# Altium footprint library pcb_library.PcbLib: 45 footprints (part 2 of 3)
Each footprint in its own frame and in the unit in brackets; x right, y up, seen from the top. Pads: shape width x height; smd on the part's side, far side on the other; paste and mask are expansions set on the pad; w line width, h text height; cw(c..) or ccw(c..) is an arc to the next point about the centre after c.
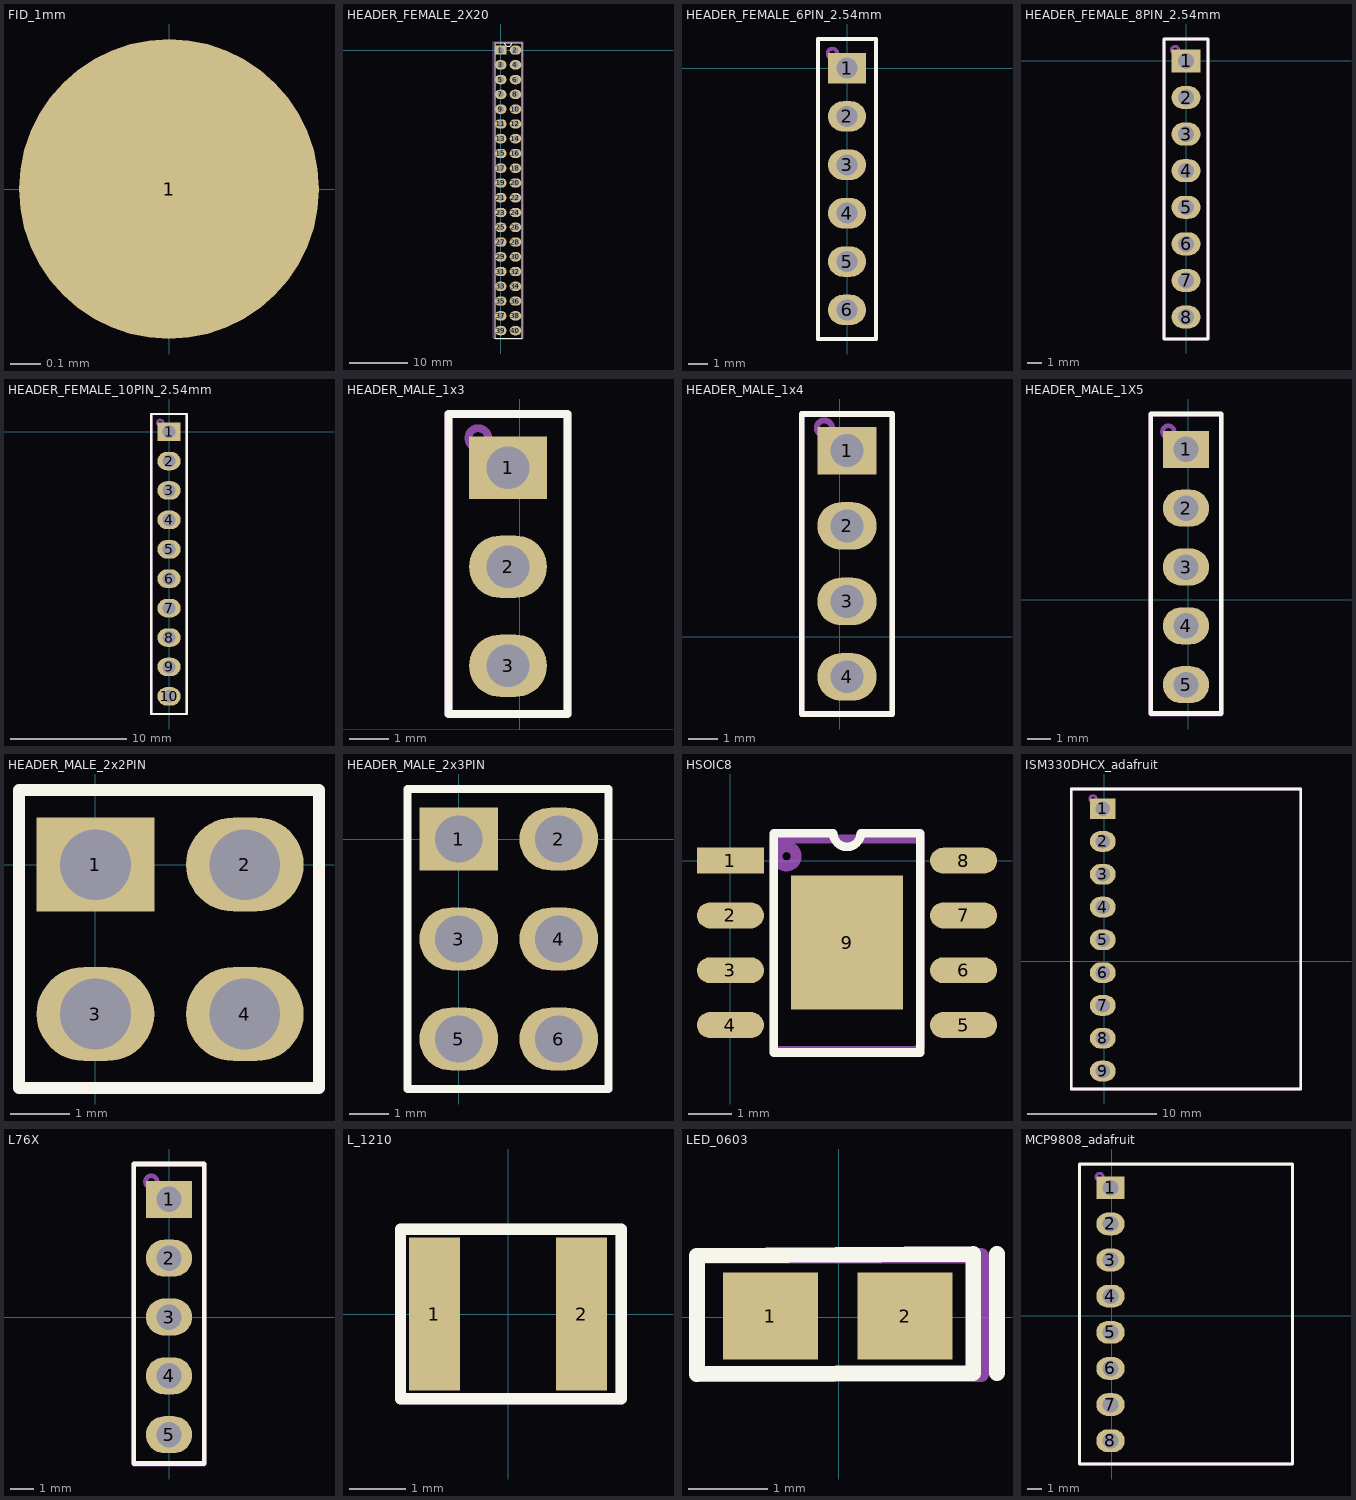
[diagram p1: the footprints below, top view; thin cyan lines are the x and y axes]

## FID_1mm [mm]
pads (1):
  round 1 smd paste-1 mask+1: 1(0,0)

## HEADER_FEMALE_2X20 [mm]
pads (40):
  rect 2x1.6 hole 1.1: 1(0,0)
  oval 2x1.6 hole 1.1: 2(2.54,0) 3(0,-2.54) 4(2.54,-2.54) 5(0,-5.08) 6(2.54,-5.08) 7(0,-7.62) 8(2.54,-7.62) 9(0,-10.16) 10(2.54,-10.16) 11(0,-12.7) 12(2.54,-12.7) 13(0,-15.24) 14(2.54,-15.24) 15(0,-17.78) 16(2.54,-17.78) 17(0,-20.32) 18(2.54,-20.32) 19(0,-22.86) 20(2.54,-22.86) 21(0,-25.4) 22(2.54,-25.4) 23(0,-27.94) 24(2.54,-27.94) 25(0,-30.48) 26(2.54,-30.48) 27(0,-33.02) 28(2.54,-33.02) 29(0,-35.56) 30(2.54,-35.56) 31(0,-38.1) 32(2.54,-38.1) 33(0,-40.64) 34(2.54,-40.64) 35(0,-43.18) 36(2.54,-43.18) 37(0,-45.72) 38(2.54,-45.72) 39(0,-48.26) 40(2.54,-48.26)
Top Overlay:
  lines w0.2: -1,-49.53 -1,1.27 1.905,1.27 cw(c1.27,1.27) 0.635,1.27 3.6,1.27 3.6,-49.53 -1,-49.53
Mechanical 29:
  lines w0.2: -1.3,-49.5 -1.1,-49.5 -0.9,-49.7 3.8,-49.7 3.8,1.4 -0.4,1.4 -1.3,1.4 -1.3,-49.5
3D body "m20-7832046_asm.stp": height 8.31, standoff -3.19, extent -1.22,-49.8 3.82,1.4

## HEADER_FEMALE_6PIN_2.54mm [mm]
pads (6):
  rect 2x1.6 hole 1.1: 1(0,0)
  oval 2x1.6 hole 1.1: 2(0,-2.54) 3(0,-5.08) 4(0,-7.62) 5(0,-10.16) 6(0,-12.7)
Top Overlay:
  lines w0.2: -1.524,-14.224 1.524,-14.224 1.524,1.524 -1.524,1.524 -1.524,-14.224
Mechanical 29:
  circle w0.2: c-0.762,0.762 r0.254
  lines w0.2: -1.524,-14.224 1.524,-14.224 1.524,1.524 -1.524,1.524 -1.524,-14.224
  text ".Designator" at 0.241,-9.906 h0.8
3D body "m20-7820642_asm.stp": height 8.31, standoff -3.19, extent -1.25,-14.17 1.25,1.47

## HEADER_FEMALE_8PIN_2.54mm [mm]
pads (8):
  rect 2x1.6 hole 1.1: 1(0,0)
  oval 2x1.6 hole 1.1: 2(0,-2.54) 3(0,-5.08) 4(0,-7.62) 5(0,-10.16) 6(0,-12.7) 7(0,-15.24) 8(0,-17.78)
Top Overlay:
  lines w0.2: -1.524,-19.304 -1.524,1.524 1.524,1.524 1.524,-19.304 -1.524,-19.304
Mechanical 29:
  circle w0.2: c-0.762,0.762 r0.254
  lines w0.2: -1.524,-19.304 -1.524,1.524 1.524,1.524 1.524,-19.304 -1.524,-19.304
  text ".Designator" at 0.241,-11.938 h0.8
3D body "m20-7820842_asm.stp": height 8.31, standoff -3.19, extent -1.25,-19.304 1.25,1.416

## HEADER_FEMALE_10PIN_2.54mm [mm]
pads (10):
  rect 2x1.6 hole 1.1: 1(0,0)
  oval 2x1.6 hole 1.1: 2(0,-2.54) 3(0,-5.08) 4(0,-7.62) 5(0,-10.16) 6(0,-12.7) 7(0,-15.24) 8(0,-17.78) 9(0,-20.32) 10(0,-22.86)
Top Overlay:
  lines w0.2: -1.524,-24.384 1.524,-24.384 1.524,1.524 -1.524,1.524 -1.524,-24.384
Mechanical 29:
  circle w0.2: c-0.762,0.762 r0.254
  lines w0.2: -1.524,-24.384 1.524,-24.384 1.524,1.524 -1.524,1.524 -1.524,-24.384
  text ".Designator" at 0.241,-15.24 h0.8
3D body "m20-7821042_asm.stp": height 8.51, standoff -2.99, extent -1.23,-24.33 1.27,1.47

## HEADER_MALE_1x3 [mm]
pads (3):
  rect 2x1.6 hole 1.1: 1(-0.304,6.72)
  oval 2x1.6 hole 1.1: 2(-0.304,4.18) 3(-0.304,1.64)
Top Overlay:
  lines w0.2: -1.828,0.4 -1.828,8.1 1.22,8.1 1.22,0.4 -1.828,0.4
Mechanical 29:
  circle w0.2: c-1.066,7.482 r0.254
  lines w0.2: -1.828,0.4 -1.828,8.1 1.22,8.1 1.22,0.4 -1.828,0.4
  text ".Designator" at -0.121,0.854 h0.8
3D body "M20-9990345.stp": height 8.64, standoff -3, extent -1.54,0.39 1,8.01

## HEADER_MALE_1x4 [mm]
pads (4):
  rect 2x1.6 hole 1.1: 1(0.247,6.27)
  oval 2x1.6 hole 1.1: 2(0.247,3.73) 3(0.247,1.19) 4(0.247,-1.35)
Top Overlay:
  lines w0.2: -1.277,-2.6 1.771,-2.6 1.771,7.5 -1.277,7.5 -1.277,-2.6
Mechanical 29:
  circle w0.2: c-0.515,7.032 r0.254
  lines w0.2: -1.277,-2.6 1.771,-2.6 1.771,7.5 -1.277,7.5 -1.277,-2.6
  text ".Designator" at 0.479,-2.046 h0.8
3D body "M20-9990445.stp": height 8.64, standoff -3, extent -1.023,-2.62 1.517,7.54

## HEADER_MALE_1X5 [mm]
pads (5):
  rect 2x1.6 hole 1.1: 1(-0.1,6.5)
  oval 2x1.6 hole 1.1: 2(-0.1,3.96) 3(-0.1,1.42) 4(-0.1,-1.12) 5(-0.1,-3.66)
Top Overlay:
  lines w0.2: -1.624,-4.9 1.424,-4.9 1.424,8.024 -1.624,8.024 -1.624,-4.9
Mechanical 29:
  circle w0.2: c-0.862,7.262 r0.254
  lines w0.2: -1.624,-4.924 -1.624,8.024 1.424,8.024 1.424,-4.924 -1.624,-4.924 ; -1.624,-4.924 -1.624,-4.924
  text ".Designator" at 0.141,-3.406 h0.8
3D body "M20-9990546.stp": height 6.1, standoff -3, extent -1.37,-4.93 1.17,7.77

## HEADER_MALE_2x2PIN [mm]
pads (4):
  rect 2x1.6 / inner rect 2x1.2 / far side rect 2x1.6 hole 1.2: 1(0,0)
  oval 2x1.6 / inner oval 2x1.2 / far side oval 2x1.6 hole 1.2: 2(2.54,0) 3(0,-2.54) 4(2.54,-2.54)
Top Overlay:
  lines w0.2: 0.635,1.27 3.8,1.27 3.8,-3.8 -1.3,-3.8 -1.3,1.27 1.905,1.27
3D body "m20-9760246_asm.stp": height 7.75, standoff -3.73, extent -1.2,-3.74 3.88,1.34

## HEADER_MALE_2x3PIN [mm]
pads (6):
  rect 2x1.6 / inner rect 2x1.2 / far side rect 2x1.6 hole 1.2: 1(0,0)
  oval 2x1.6 / inner oval 2x1.2 / far side oval 2x1.6 hole 1.2: 2(2.54,0) 3(0,-2.54) 4(2.54,-2.54) 5(0,-5.08) 6(2.54,-5.08)
Top Overlay:
  lines w0.2: 0.635,1.27 3.8,1.27 3.8,-6.35 -1.3,-6.35 -1.3,1.27 1.905,1.27
3D body "m20-9980346_asm.stp": height 8.64, standoff -3.04, extent -1.34,-6.32 3.74,1.3

## HSOIC8 [mm]
pads (9):
  rect 1.55x0.6 smd: 1(0,0)
  oval 1.55x0.6 smd: 2(0,-1.27) 3(0,-2.54) 4(0,-3.81) 5(5.4,-3.81) 6(5.4,-2.54) 7(5.4,-1.27) 8(5.4,0)
  rect 2.6x3.1 smd: 9(2.7,-1.9)
Top Overlay:
  lines w0.2: 1,-4.445 4.4,-4.445 4.4,0.635 3.017,0.635 cw(c2.7,0.635) 2.382,0.635 1,0.635 1,-4.445
Mechanical 29:
  circle w0.254: c1.3,0.1 r0.224
  lines w0.2: 1,-4.4 1,0.5 4.4,0.5 4.4,-4.3 4.3,-4.4 1,-4.4
3D body "LMR33610ADDAR.stp": height 1.7, standoff 0, extent -0.3,-4.35 5.7,0.55

## ISM330DHCX_adafruit [mm]
pads (9):
  rect 2x1.6 hole 1.1: 1(-0.092,11.804)
  oval 2x1.6 hole 1.1: 2(-0.092,9.264) 3(-0.092,6.724) 4(-0.092,4.184) 5(-0.092,1.644) 6(-0.092,-0.896) 7(-0.092,-3.436) 8(-0.092,-5.976) 9(-0.092,-8.516)
Top Overlay:
  lines w0.2: -2.54,-9.906 15.24,-9.906 15.24,13.328 -2.54,13.328 -2.54,-9.906
Mechanical 29:
  circle w0.2: c-0.854,12.566 r0.254
  lines w0.2: -2.54,-9.906 -2.54,13.328 15.24,13.328 15.24,-9.906 -2.54,-9.906
  text ".Designator" at 0.149,-3.436 h0.8
3D body "M20-7820946.stp": height 8.65, standoff -3.25, extent -1.342,-9.986 1.158,13.274
3D body: height 11, standoff 8.65, extent -2.54,-9.906 15.24,13.328

## L76X [mm]
pads (5):
  rect 2x1.6 hole 1.1: 1(0,5.08)
  oval 2x1.6 hole 1.1: 2(0,2.54) 3(0,0) 4(0,-2.54) 5(0,-5.08)
Top Overlay:
  lines w0.2: -1.524,-6.32 -1.524,6.604 1.524,6.604 1.524,-6.32 -1.524,-6.32
Mechanical 29:
  circle w0.2: c-0.762,5.842 r0.254
  lines w0.2: -1.524,-6.344 -1.524,-6.344 ; -1.524,-6.344 1.524,-6.344 1.524,6.604 -1.524,6.604 -1.524,-6.344
  text ".Designator" at 0.241,-4.826 h0.8
3D body "M20-9990546.stp": height 6.1, standoff -3, extent -1.27,-6.35 1.27,6.35

## L_1210 [mm]
pads (2):
  rect 0.9x2.7 smd: 1(-1.3,0) 2(1.3,0)
Top Overlay:
  lines w0.2: -1.9,-1.5 2,-1.5 2,1.5 -1.9,1.5 -1.9,-1.2 -1.9,-1.5
Mechanical 29:
  lines w0.2: -1.9,-1.5 2,-1.5 2,1.5 -1.9,1.5 -1.9,-1.5
  text ".Designator" at -1.246,-0.179 h0.8
3D body "L1210R2R2MDWIT.stp": height 2.7, standoff 0, extent -1.6,-1.25 1.6,1.25

## LED_0603 [mm]
pads (2):
  rect 1.2x1.1 smd: 1(-0.862,0.018) 2(0.838,0.018)
Top Overlay:
  lines w0.2: 2,-0.7 2,0.8 ; -1.79,-0.712 -1.79,0.78 1.7,0.8 1.7,-0.7 -1.79,-0.712
Mechanical 29:
  lines w0.2: -1.79,-0.712 1.8,-0.712 1.8,0.78 -1.79,0.78
  text ".Designator" at -1.536,-0.192 h0.8
3D body "LO_L29K-H2K1-24-Z.stp": height 0.67, standoff 0, extent -0.85,-0.4 0.85,0.4

## MCP9808_adafruit [mm]
pads (8):
  rect 2x1.6 hole 1.1: 1(-0.1,9)
  oval 2x1.6 hole 1.1: 2(-0.1,6.46) 3(-0.1,3.92) 4(-0.1,1.38) 5(-0.1,-1.16) 6(-0.1,-3.7) 7(-0.1,-6.24) 8(-0.1,-8.78)
Top Overlay:
  lines w0.2: -2.286,-10.414 12.7,-10.414 12.7,10.668 -2.286,10.668 -2.286,-10.414
Mechanical 29:
  circle w0.2: c-0.862,9.762 r0.254
  lines w0.2: -2.286,-10.414 12.7,-10.414 12.7,10.631 -2.286,10.631 -2.286,-10.414
  text ".Designator" at 0.141,-2.938 h0.8
3D body "m20-7820842_asm.stp": height 8.31, standoff -3.19, extent -1.35,-10.25 1.15,10.47
3D body: height 10, standoff 8, extent -2.286,-10.414 12.7,10.668